# Altium schematic symbol library Renesas Logic.SchLib: 1013 symbols (part 12 of 12)
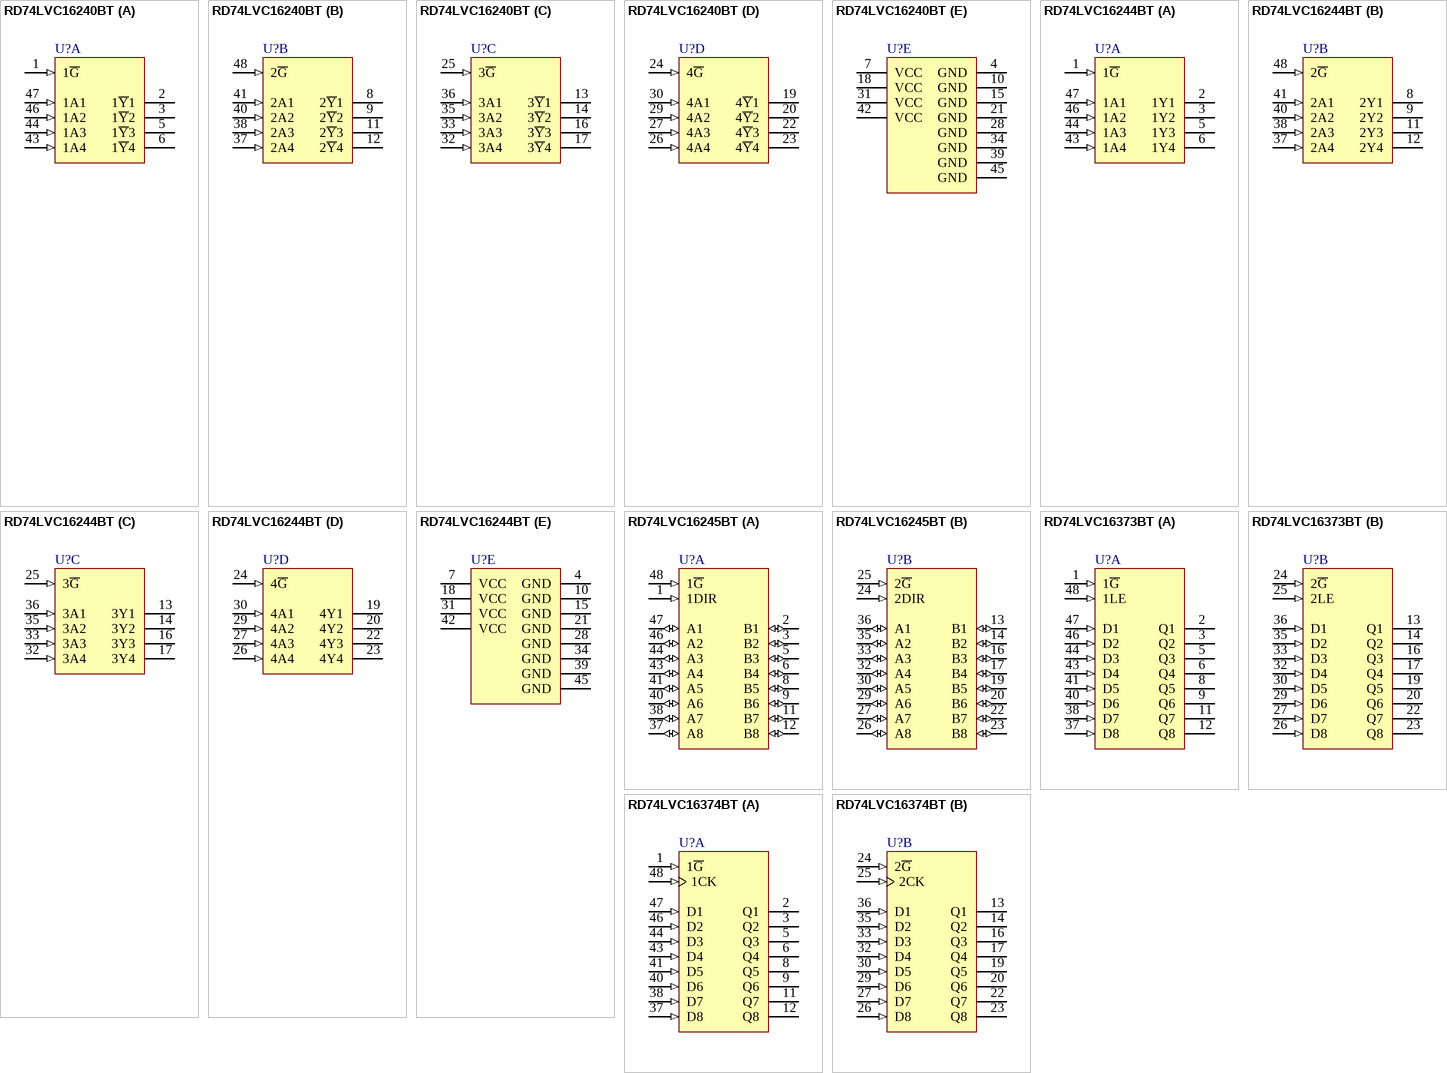
[diagram p64: symbols RD74LVC16240BT to RD74LVC16374BT]

## RD74LVC16374BT
designator U?
16-bit D-Type Flip Flops with 3-State Outputs; Published: 10-Feb-2010; DatasheetVersion: Rev.1.00, Jan-2005; PackageVersion: Sep-2005; PackageReference: PTSP0048KA-A; Publisher: Altium Limited; PackageDescription: 48-Pin Thin Shrink Small Outline Package, 12.5 x 6.1 mm Body, 0.5 mm Pitch; Code_JEITA: P-TSSOP48-6.1x12.5-0.50; ComponentLink1Description: Manufacturer Link; ComponentLink1URL: http://sg.renesas.com/fmwk.jsp?cnt=hd74lvc_root.jsp&fp=/products/standard_ic/general_purpose_logic/low_voltage_logic/hd74lvc/; ComponentLink2Description: Datasheet; ComponentLink2URL: http://documentation.renesas.com/eng/products/logic/rej03d0501_rd74lvc16374b.pdf; ComponentLink3Description: Packaging Specification; ComponentLink3URL: http://sg.renesas.com/media/products/common_info/package/pdf/ic/code/ptsp0048ka_a.pdf
footprint PTSP0048KA-A_N (TSSOP, 48-Leads, Body 12.5x6.1mm, Pitch 0.5mm, IPC Medium Density)
footprint PTSP0048KA-A_L (TSSOP, 48-Leads, Body 12.5x6.1mm, Pitch 0.5mm, IPC High Density)
footprint PTSP0048KA-A_M (TSSOP, 48-Leads, Body 12.5x6.1mm, Pitch 0.5mm, IPC Low Density)
pins on every part: 4 GND (power) hidden, 7 VCC (power) hidden, 10 GND (power) hidden, 15 GND (power) hidden, 18 VCC (power) hidden, 21 GND (power) hidden, 28 GND (power) hidden, 31 VCC (power) hidden, 34 GND (power) hidden, 39 GND (power) hidden, 42 VCC (power) hidden, 45 GND (power) hidden
part A pins: 1 1~{G} (in), 2 Q1 (hiz), 3 Q2 (hiz), 5 Q3 (hiz), 6 Q4 (hiz), 8 Q5 (hiz), 9 Q6 (hiz), 11 Q7 (hiz), 12 Q8 (hiz), 37 D8 (in), 38 D7 (in), 40 D6 (in), 41 D5 (in), 43 D4 (in), 44 D3 (in), 46 D2 (in), 47 D1 (in), 48 1CK (in)
part B pins: 13 Q1 (hiz), 14 Q2 (hiz), 16 Q3 (hiz), 17 Q4 (hiz), 19 Q5 (hiz), 20 Q6 (hiz), 22 Q7 (hiz), 23 Q8 (hiz), 24 2~{G} (in), 25 2CK (in), 26 D8 (in), 27 D7 (in), 29 D6 (in), 30 D5 (in), 32 D4 (in), 33 D3 (in), 35 D2 (in), 36 D1 (in)